# Altium integrated library Lattice CPLD ispLSI.IntLib: 471 symbols (part 2 of 26) (continued)
## ispLSI1032E-70LJI (continued)

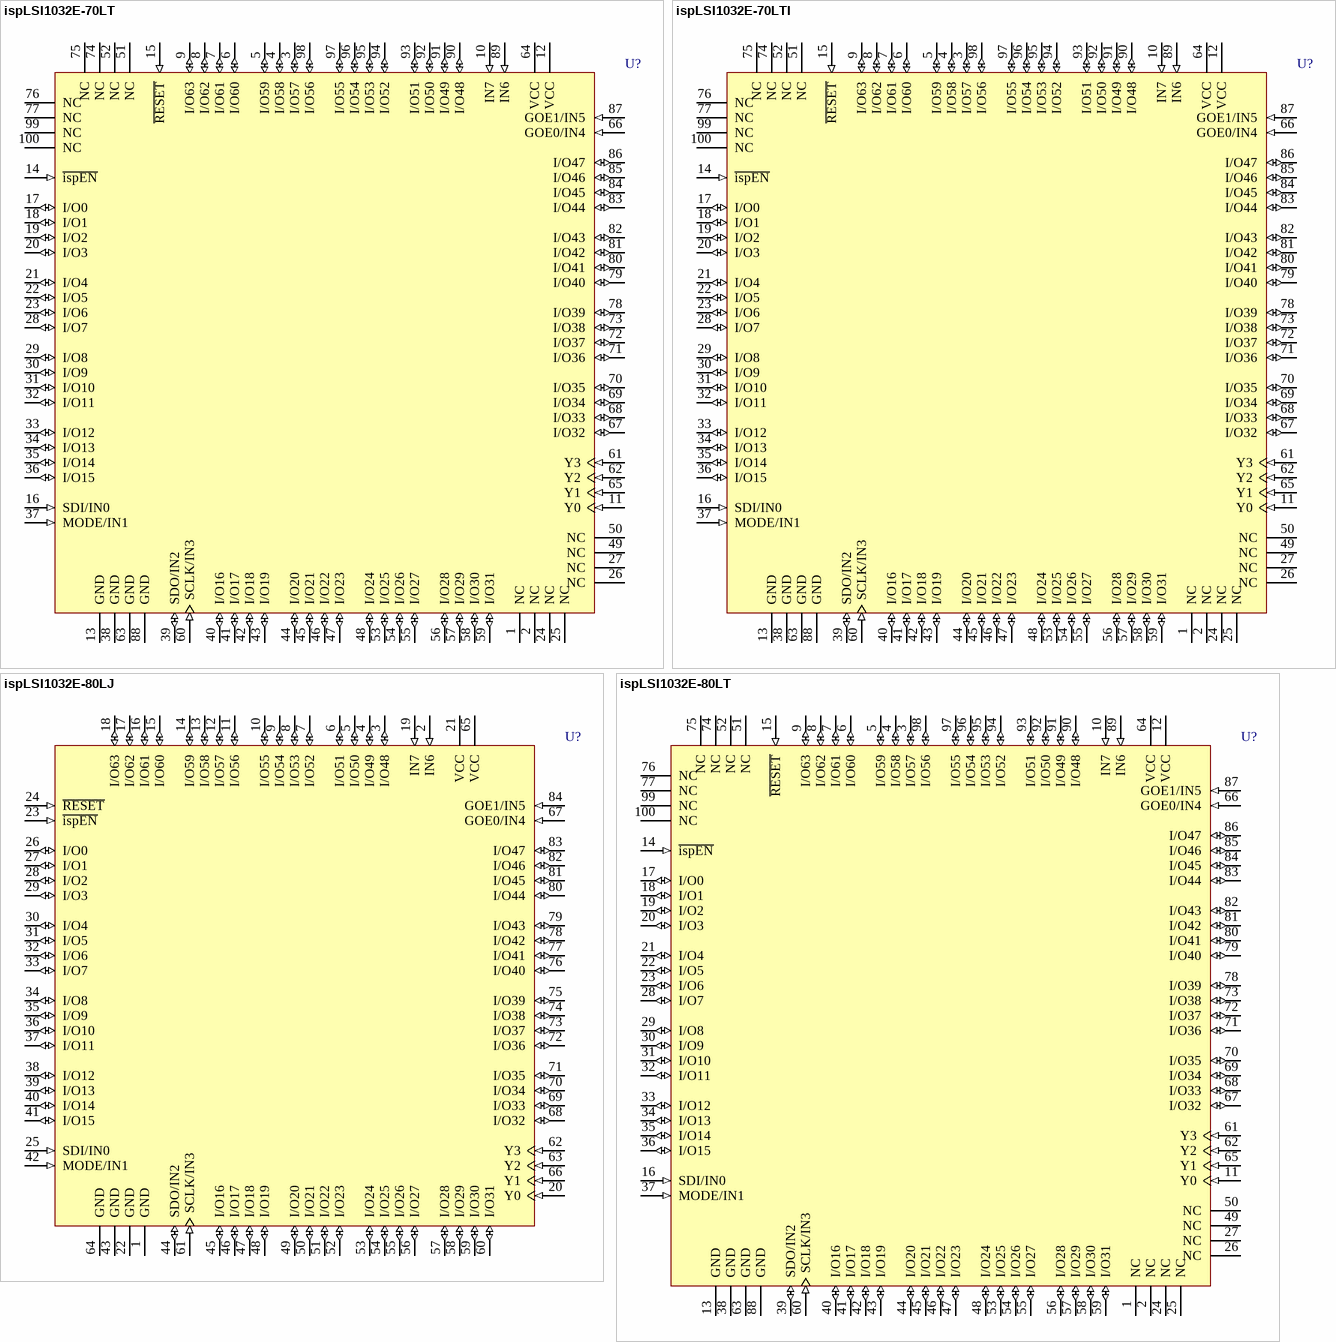
[diagram p9: symbols ispLSI1032E-70LT to ispLSI1032E-80LT]

## ispLSI1032E-70LT
designator U?
In-System Programmable High-Density PLD; Note: Pins 16, 37, 39, 60, 66 & 87 have dual function capability; Pins 66 & 87 are software selectable.; Published: 23-Sep-2002; LatestRevisionDate: 13-Apr-2006; LatestRevisionNote: IPC-7351 Footprint Added.; DatasheetVersion: Oct-1998; PackageVersion: pkg_32, Aug-2005; PackageReference: TQFP100; Publisher: Altium Limited; PackageDescription: 100-Pin Thin Quad Flat Pack (TQFP100); Code_JEDEC: MS-026-BED; ComponentLink1Description: Manufacturer Link; ComponentLink1URL: http://www.latticesemi.com/products/mature/index.cfm; ComponentLink2Description: Datasheet; ComponentLink2URL: http://www.latticesemi.com/lit/docs/datasheets/cpld/1032e.pdf
footprint TQFP100_N (Thin QFP, 100-Leads, Body 14x14mm, Pitch 0.5mm, IPC Medium Density)
footprint TQFP100_L (Thin QFP, 100-Leads, Body 14x14mm, Pitch 0.5mm, IPC High Density)
footprint TQFP100_M (Thin QFP, 100-Leads, Body 14x14mm, Pitch 0.5mm, IPC Low Density)
3D model 1032E-TQFP100 (100-Pin Thin Quad Flat Pack (TQFP100))
pins: 1 NC, 2 NC, 3 I/O57 (io), 4 I/O58 (io), 5 I/O59 (io), 6 I/O60 (io), 7 I/O61 (io), 8 I/O62 (io), 9 I/O63 (io), 10 IN7 (in), 11 Y0 (in), 12 VCC (power), 13 GND (power), 14 ~{ispEN} (in), 15 ~{RESET} (in), 16 SDI/IN0 (in), 17 I/O0 (io), 18 I/O1 (io), 19 I/O2 (io), 20 I/O3 (io), 21 I/O4 (io), 22 I/O5 (io), 23 I/O6 (io), 24 NC, 25 NC, 26 NC, 27 NC, 28 I/O7 (io), 29 I/O8 (io), 30 I/O9 (io), 31 I/O10 (io), 32 I/O11 (io), 33 I/O12 (io), 34 I/O13 (io), 35 I/O14 (io), 36 I/O15 (io), 37 MODE/IN1 (in), 38 GND (power), 39 SDO/IN2 (io), 40 I/O16 (io), 41 I/O17 (io), 42 I/O18 (io), 43 I/O19 (io), 44 I/O20 (io), 45 I/O21 (io), 46 I/O22 (io), 47 I/O23 (io), 48 I/O24 (io), 49 NC, 50 NC, 51 NC, 52 NC, 53 I/O25 (io), 54 I/O26 (io), 55 I/O27 (io), 56 I/O28 (io), 57 I/O29 (io), 58 I/O30 (io), 59 I/O31 (io), 60 SCLK/IN3 (in), 61 Y3 (in), 62 Y2 (in), 63 GND (power), 64 VCC (power), 65 Y1 (in), 66 GOE0/IN4 (in), 67 I/O32 (io), 68 I/O33 (io), 69 I/O34 (io), 70 I/O35 (io), 71 I/O36 (io), 72 I/O37 (io), 73 I/O38 (io), 74 NC, 75 NC, 76 NC, 77 NC, 78 I/O39 (io), 79 I/O40 (io), 80 I/O41 (io), 81 I/O42 (io), 82 I/O43 (io), 83 I/O44 (io), 84 I/O45 (io), 85 I/O46 (io), 86 I/O47 (io), 87 GOE1/IN5 (in), 88 GND (power), 89 IN6 (in), 90 I/O48 (io), 91 I/O49 (io), 92 I/O50 (io), 93 I/O51 (io), 94 I/O52 (io), 95 I/O53 (io), 96 I/O54 (io), 97 I/O55 (io), 98 I/O56 (io), 99 NC, 100 NC

## ispLSI1032E-70LTI
designator U?
In-System Programmable High-Density PLD; Note: Pins 16, 37, 39, 60, 66 & 87 have dual function capability; Pins 66 & 87 are software selectable.; Published: 23-Sep-2002; LatestRevisionDate: 13-Apr-2006; LatestRevisionNote: IPC-7351 Footprint Added.; DatasheetVersion: Oct-1998; PackageVersion: pkg_32, Aug-2005; PackageReference: TQFP100; Publisher: Altium Limited; PackageDescription: 100-Pin Thin Quad Flat Pack (TQFP100); Code_JEDEC: MS-026-BED; ComponentLink1Description: Manufacturer Link; ComponentLink1URL: http://www.latticesemi.com/products/mature/index.cfm; ComponentLink2Description: Datasheet; ComponentLink2URL: http://www.latticesemi.com/lit/docs/datasheets/cpld/1032e.pdf
footprint TQFP100_N (Thin QFP, 100-Leads, Body 14x14mm, Pitch 0.5mm, IPC Medium Density)
footprint TQFP100_L (Thin QFP, 100-Leads, Body 14x14mm, Pitch 0.5mm, IPC High Density)
footprint TQFP100_M (Thin QFP, 100-Leads, Body 14x14mm, Pitch 0.5mm, IPC Low Density)
3D model 1032E-TQFP100 (100-Pin Thin Quad Flat Pack (TQFP100))
pins: 1 NC, 2 NC, 3 I/O57 (io), 4 I/O58 (io), 5 I/O59 (io), 6 I/O60 (io), 7 I/O61 (io), 8 I/O62 (io), 9 I/O63 (io), 10 IN7 (in), 11 Y0 (in), 12 VCC (power), 13 GND (power), 14 ~{ispEN} (in), 15 ~{RESET} (in), 16 SDI/IN0 (in), 17 I/O0 (io), 18 I/O1 (io), 19 I/O2 (io), 20 I/O3 (io), 21 I/O4 (io), 22 I/O5 (io), 23 I/O6 (io), 24 NC, 25 NC, 26 NC, 27 NC, 28 I/O7 (io), 29 I/O8 (io), 30 I/O9 (io), 31 I/O10 (io), 32 I/O11 (io), 33 I/O12 (io), 34 I/O13 (io), 35 I/O14 (io), 36 I/O15 (io), 37 MODE/IN1 (in), 38 GND (power), 39 SDO/IN2 (io), 40 I/O16 (io), 41 I/O17 (io), 42 I/O18 (io), 43 I/O19 (io), 44 I/O20 (io), 45 I/O21 (io), 46 I/O22 (io), 47 I/O23 (io), 48 I/O24 (io), 49 NC, 50 NC, 51 NC, 52 NC, 53 I/O25 (io), 54 I/O26 (io), 55 I/O27 (io), 56 I/O28 (io), 57 I/O29 (io), 58 I/O30 (io), 59 I/O31 (io), 60 SCLK/IN3 (in), 61 Y3 (in), 62 Y2 (in), 63 GND (power), 64 VCC (power), 65 Y1 (in), 66 GOE0/IN4 (in), 67 I/O32 (io), 68 I/O33 (io), 69 I/O34 (io), 70 I/O35 (io), 71 I/O36 (io), 72 I/O37 (io), 73 I/O38 (io), 74 NC, 75 NC, 76 NC, 77 NC, 78 I/O39 (io), 79 I/O40 (io), 80 I/O41 (io), 81 I/O42 (io), 82 I/O43 (io), 83 I/O44 (io), 84 I/O45 (io), 85 I/O46 (io), 86 I/O47 (io), 87 GOE1/IN5 (in), 88 GND (power), 89 IN6 (in), 90 I/O48 (io), 91 I/O49 (io), 92 I/O50 (io), 93 I/O51 (io), 94 I/O52 (io), 95 I/O53 (io), 96 I/O54 (io), 97 I/O55 (io), 98 I/O56 (io), 99 NC, 100 NC

## ispLSI1032E-80LJ
designator U?
In-System Programmable High-Density PLD; Note: Pins 25, 42, 44, 61, 67 & 84 have dual function capability; Pins 67 & 84 are software selectable.; Published: 23-Sep-2002; LatestRevisionDate: 13-Apr-2006; LatestRevisionNote: IPC-7351 Footprint Added.; DatasheetVersion: Oct-1998; PackageVersion: pkg_32, Aug-2005; PackageReference: PLCC84; Publisher: Altium Limited; PackageDescription: 84-Pin Leaded Chip Carrier 1.27 mm Pitch; Code_IPC: PLCC-84; ComponentLink1Description: Manufacturer Link; ComponentLink1URL: http://www.latticesemi.com/products/mature/index.cfm; ComponentLink2Description: Datasheet; ComponentLink2URL: http://www.latticesemi.com/lit/docs/datasheets/cpld/1032e.pdf
footprint PLCC84_N (Leaded Chip Carrier, 84-Leads, Body 29.3x29.3mm, Pitch 1.27mm, IPC Medium Density)
footprint PLCC84_L (Leaded Chip Carrier, 84-Leads, Body 29.3x29.3mm, Pitch 1.27mm, IPC High Density)
footprint PLCC84_M (Leaded Chip Carrier, 84-Leads, Body 29.3x29.3mm, Pitch 1.27mm, IPC Low Density)
3D model 1032E-PLCC84 (84-Pin Leaded Chip Carrier 1.27 mm Pitch)
pins: 1 GND (power), 2 IN6 (in), 3 I/O48 (io), 4 I/O49 (io), 5 I/O50 (io), 6 I/O51 (io), 7 I/O52 (io), 8 I/O53 (io), 9 I/O54 (io), 10 I/O55 (io), 11 I/O56 (io), 12 I/O57 (io), 13 I/O58 (io), 14 I/O59 (io), 15 I/O60 (io), 16 I/O61 (io), 17 I/O62 (io), 18 I/O63 (io), 19 IN7 (in), 20 Y0 (in), 21 VCC (power), 22 GND (power), 23 ~{isp}~{EN} (in), 24 ~{RESET} (in), 25 SDI/IN0 (in), 26 I/O0 (io), 27 I/O1 (io), 28 I/O2 (io), 29 I/O3 (io), 30 I/O4 (io), 31 I/O5 (io), 32 I/O6 (io), 33 I/O7 (io), 34 I/O8 (io), 35 I/O9 (io), 36 I/O10 (io), 37 I/O11 (io), 38 I/O12 (io), 39 I/O13 (io), 40 I/O14 (io), 41 I/O15 (io), 42 MODE/IN1 (in), 43 GND (power), 44 SDO/IN2 (io), 45 I/O16 (io), 46 I/O17 (io), 47 I/O18 (io), 48 I/O19 (io), 49 I/O20 (io), 50 I/O21 (io), 51 I/O22 (io), 52 I/O23 (io), 53 I/O24 (io), 54 I/O25 (io), 55 I/O26 (io), 56 I/O27 (io), 57 I/O28 (io), 58 I/O29 (io), 59 I/O30 (io), 60 I/O31 (io), 61 SCLK/IN3 (in), 62 Y3 (in), 63 Y2 (in), 64 GND (power), 65 VCC (power), 66 Y1 (in), 67 GOE0/IN4 (in), 68 I/O32 (io), 69 I/O33 (io), 70 I/O34 (io), 71 I/O35 (io), 72 I/O36 (io), 73 I/O37 (io), 74 I/O38 (io), 75 I/O39 (io), 76 I/O40 (io), 77 I/O41 (io), 78 I/O42 (io), 79 I/O43 (io), 80 I/O44 (io), 81 I/O45 (io), 82 I/O46 (io), 83 I/O47 (io), 84 GOE1/IN5 (in)

## ispLSI1032E-80LT
designator U?
In-System Programmable High-Density PLD; Note: Pins 16, 37, 39, 60, 66 & 87 have dual function capability; Pins 66 & 87 are software selectable.; Published: 23-Sep-2002; LatestRevisionDate: 13-Apr-2006; LatestRevisionNote: IPC-7351 Footprint Added.; DatasheetVersion: Oct-1998; PackageVersion: pkg_32, Aug-2005; PackageReference: TQFP100; Publisher: Altium Limited; PackageDescription: 100-Pin Thin Quad Flat Pack (TQFP100); Code_JEDEC: MS-026-BED; ComponentLink1Description: Manufacturer Link; ComponentLink1URL: http://www.latticesemi.com/products/mature/index.cfm; ComponentLink2Description: Datasheet; ComponentLink2URL: http://www.latticesemi.com/lit/docs/datasheets/cpld/1032e.pdf
footprint TQFP100_N (Thin QFP, 100-Leads, Body 14x14mm, Pitch 0.5mm, IPC Medium Density)
footprint TQFP100_L (Thin QFP, 100-Leads, Body 14x14mm, Pitch 0.5mm, IPC High Density)
footprint TQFP100_M (Thin QFP, 100-Leads, Body 14x14mm, Pitch 0.5mm, IPC Low Density)
3D model 1032E-TQFP100 (100-Pin Thin Quad Flat Pack (TQFP100))
pins: 1 NC, 2 NC, 3 I/O57 (io), 4 I/O58 (io), 5 I/O59 (io), 6 I/O60 (io), 7 I/O61 (io), 8 I/O62 (io), 9 I/O63 (io), 10 IN7 (in), 11 Y0 (in), 12 VCC (power), 13 GND (power), 14 ~{ispEN} (in), 15 ~{RESET} (in), 16 SDI/IN0 (in), 17 I/O0 (io), 18 I/O1 (io), 19 I/O2 (io), 20 I/O3 (io), 21 I/O4 (io), 22 I/O5 (io), 23 I/O6 (io), 24 NC, 25 NC, 26 NC, 27 NC, 28 I/O7 (io), 29 I/O8 (io), 30 I/O9 (io), 31 I/O10 (io), 32 I/O11 (io), 33 I/O12 (io), 34 I/O13 (io), 35 I/O14 (io), 36 I/O15 (io), 37 MODE/IN1 (in), 38 GND (power), 39 SDO/IN2 (io), 40 I/O16 (io), 41 I/O17 (io), 42 I/O18 (io), 43 I/O19 (io), 44 I/O20 (io), 45 I/O21 (io), 46 I/O22 (io), 47 I/O23 (io), 48 I/O24 (io), 49 NC, 50 NC, 51 NC, 52 NC, 53 I/O25 (io), 54 I/O26 (io), 55 I/O27 (io), 56 I/O28 (io), 57 I/O29 (io), 58 I/O30 (io), 59 I/O31 (io), 60 SCLK/IN3 (in), 61 Y3 (in), 62 Y2 (in), 63 GND (power), 64 VCC (power), 65 Y1 (in), 66 GOE0/IN4 (in), 67 I/O32 (io), 68 I/O33 (io), 69 I/O34 (io), 70 I/O35 (io), 71 I/O36 (io), 72 I/O37 (io), 73 I/O38 (io), 74 NC, 75 NC, 76 NC, 77 NC, 78 I/O39 (io), 79 I/O40 (io), 80 I/O41 (io), 81 I/O42 (io), 82 I/O43 (io), 83 I/O44 (io), 84 I/O45 (io), 85 I/O46 (io), 86 I/O47 (io), 87 GOE1/IN5 (in), 88 GND (power), 89 IN6 (in), 90 I/O48 (io), 91 I/O49 (io), 92 I/O50 (io), 93 I/O51 (io), 94 I/O52 (io), 95 I/O53 (io), 96 I/O54 (io), 97 I/O55 (io), 98 I/O56 (io), 99 NC, 100 NC

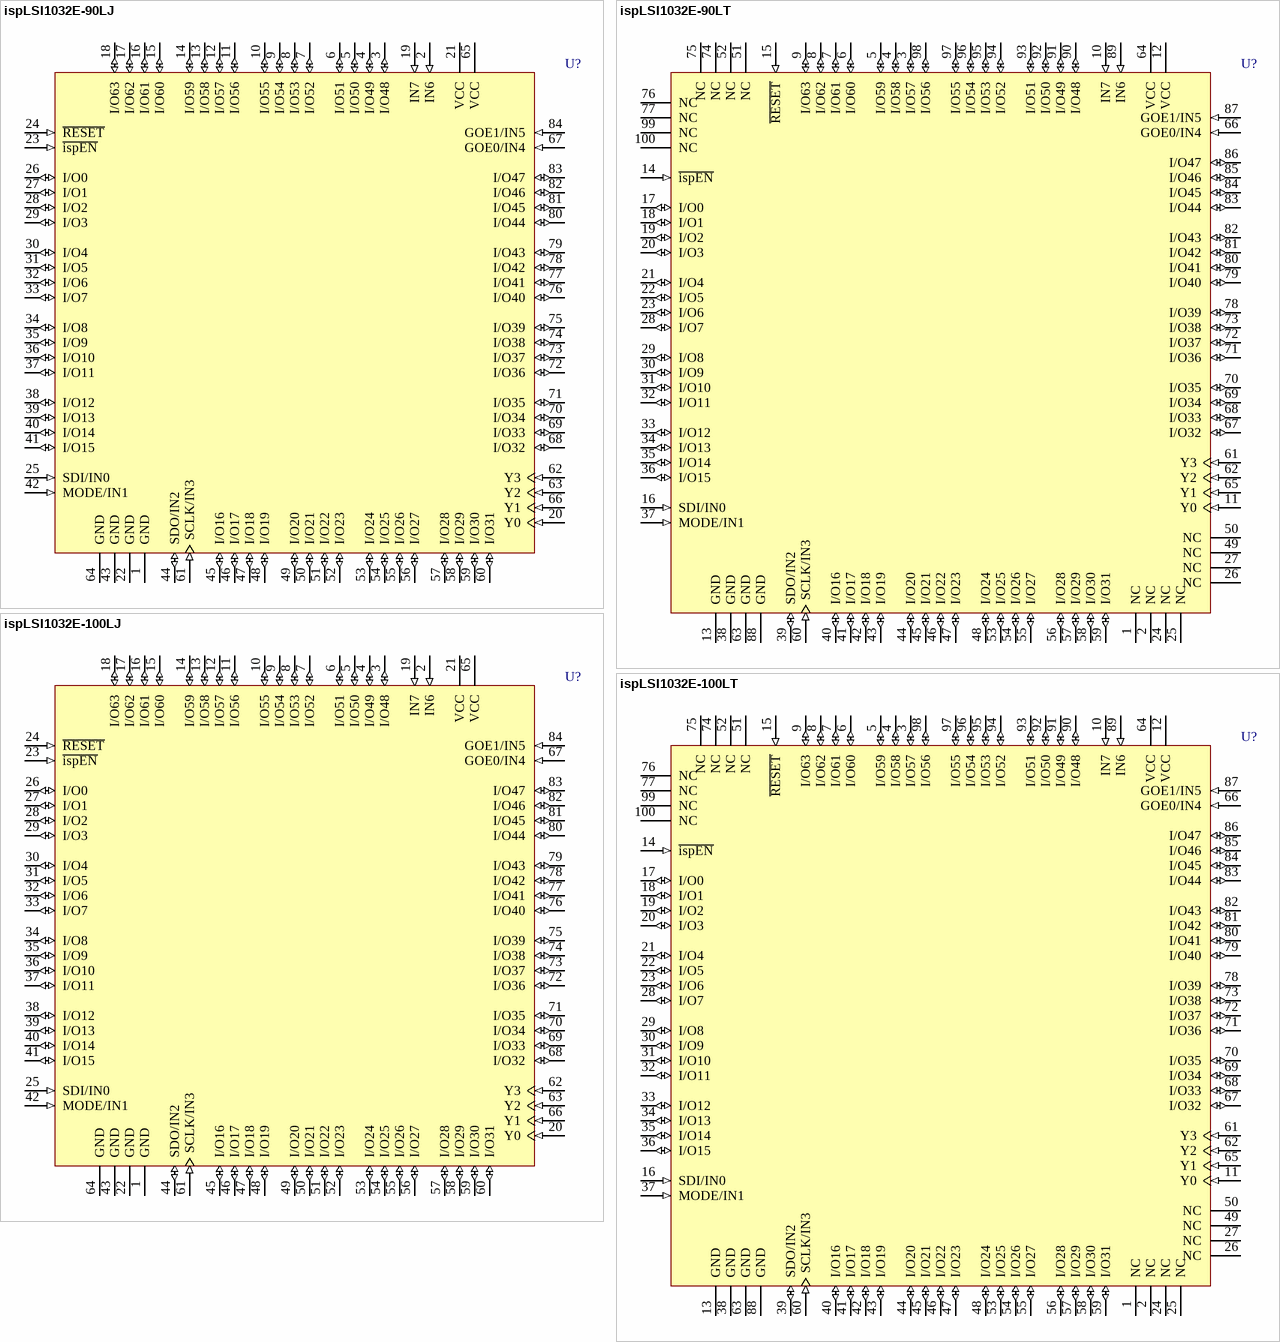
[diagram p10: symbols ispLSI1032E-90LJ to ispLSI1032E-100LT]

## ispLSI1032E-90LJ
designator U?
In-System Programmable High-Density PLD; Note: Pins 25, 42, 44, 61, 67 & 84 have dual function capability; Pins 67 & 84 are software selectable.; Published: 23-Sep-2002; LatestRevisionDate: 13-Apr-2006; LatestRevisionNote: IPC-7351 Footprint Added.; DatasheetVersion: Oct-1998; PackageVersion: pkg_32, Aug-2005; PackageReference: PLCC84; Publisher: Altium Limited; PackageDescription: 84-Pin Leaded Chip Carrier 1.27 mm Pitch; Code_IPC: PLCC-84; ComponentLink1Description: Manufacturer Link; ComponentLink1URL: http://www.latticesemi.com/products/mature/index.cfm; ComponentLink2Description: Datasheet; ComponentLink2URL: http://www.latticesemi.com/lit/docs/datasheets/cpld/1032e.pdf
footprint PLCC84_N (Leaded Chip Carrier, 84-Leads, Body 29.3x29.3mm, Pitch 1.27mm, IPC Medium Density)
footprint PLCC84_L (Leaded Chip Carrier, 84-Leads, Body 29.3x29.3mm, Pitch 1.27mm, IPC High Density)
footprint PLCC84_M (Leaded Chip Carrier, 84-Leads, Body 29.3x29.3mm, Pitch 1.27mm, IPC Low Density)
3D model 1032E-PLCC84 (84-Pin Leaded Chip Carrier 1.27 mm Pitch)
pins: 1 GND (power), 2 IN6 (in), 3 I/O48 (io), 4 I/O49 (io), 5 I/O50 (io), 6 I/O51 (io), 7 I/O52 (io), 8 I/O53 (io), 9 I/O54 (io), 10 I/O55 (io), 11 I/O56 (io), 12 I/O57 (io), 13 I/O58 (io), 14 I/O59 (io), 15 I/O60 (io), 16 I/O61 (io), 17 I/O62 (io), 18 I/O63 (io), 19 IN7 (in), 20 Y0 (in), 21 VCC (power), 22 GND (power), 23 ~{isp}~{EN} (in), 24 ~{RESET} (in), 25 SDI/IN0 (in), 26 I/O0 (io), 27 I/O1 (io), 28 I/O2 (io), 29 I/O3 (io), 30 I/O4 (io), 31 I/O5 (io), 32 I/O6 (io), 33 I/O7 (io), 34 I/O8 (io), 35 I/O9 (io), 36 I/O10 (io), 37 I/O11 (io), 38 I/O12 (io), 39 I/O13 (io), 40 I/O14 (io), 41 I/O15 (io), 42 MODE/IN1 (in), 43 GND (power), 44 SDO/IN2 (io), 45 I/O16 (io), 46 I/O17 (io), 47 I/O18 (io), 48 I/O19 (io), 49 I/O20 (io), 50 I/O21 (io), 51 I/O22 (io), 52 I/O23 (io), 53 I/O24 (io), 54 I/O25 (io), 55 I/O26 (io), 56 I/O27 (io), 57 I/O28 (io), 58 I/O29 (io), 59 I/O30 (io), 60 I/O31 (io), 61 SCLK/IN3 (in), 62 Y3 (in), 63 Y2 (in), 64 GND (power), 65 VCC (power), 66 Y1 (in), 67 GOE0/IN4 (in), 68 I/O32 (io), 69 I/O33 (io), 70 I/O34 (io), 71 I/O35 (io), 72 I/O36 (io), 73 I/O37 (io), 74 I/O38 (io), 75 I/O39 (io), 76 I/O40 (io), 77 I/O41 (io), 78 I/O42 (io), 79 I/O43 (io), 80 I/O44 (io), 81 I/O45 (io), 82 I/O46 (io), 83 I/O47 (io), 84 GOE1/IN5 (in)

## ispLSI1032E-90LT
designator U?
In-System Programmable High-Density PLD; Note: Pins 16, 37, 39, 60, 66 & 87 have dual function capability; Pins 66 & 87 are software selectable.; Published: 23-Sep-2002; LatestRevisionDate: 13-Apr-2006; LatestRevisionNote: IPC-7351 Footprint Added.; DatasheetVersion: Oct-1998; PackageVersion: pkg_32, Aug-2005; PackageReference: TQFP100; Publisher: Altium Limited; PackageDescription: 100-Pin Thin Quad Flat Pack (TQFP100); Code_JEDEC: MS-026-BED; ComponentLink1Description: Manufacturer Link; ComponentLink1URL: http://www.latticesemi.com/products/mature/index.cfm; ComponentLink2Description: Datasheet; ComponentLink2URL: http://www.latticesemi.com/lit/docs/datasheets/cpld/1032e.pdf
footprint TQFP100_N (Thin QFP, 100-Leads, Body 14x14mm, Pitch 0.5mm, IPC Medium Density)
footprint TQFP100_L (Thin QFP, 100-Leads, Body 14x14mm, Pitch 0.5mm, IPC High Density)
footprint TQFP100_M (Thin QFP, 100-Leads, Body 14x14mm, Pitch 0.5mm, IPC Low Density)
3D model 1032E-TQFP100 (100-Pin Thin Quad Flat Pack (TQFP100))
pins: 1 NC, 2 NC, 3 I/O57 (io), 4 I/O58 (io), 5 I/O59 (io), 6 I/O60 (io), 7 I/O61 (io), 8 I/O62 (io), 9 I/O63 (io), 10 IN7 (in), 11 Y0 (in), 12 VCC (power), 13 GND (power), 14 ~{ispEN} (in), 15 ~{RESET} (in), 16 SDI/IN0 (in), 17 I/O0 (io), 18 I/O1 (io), 19 I/O2 (io), 20 I/O3 (io), 21 I/O4 (io), 22 I/O5 (io), 23 I/O6 (io), 24 NC, 25 NC, 26 NC, 27 NC, 28 I/O7 (io), 29 I/O8 (io), 30 I/O9 (io), 31 I/O10 (io), 32 I/O11 (io), 33 I/O12 (io), 34 I/O13 (io), 35 I/O14 (io), 36 I/O15 (io), 37 MODE/IN1 (in), 38 GND (power), 39 SDO/IN2 (io), 40 I/O16 (io), 41 I/O17 (io), 42 I/O18 (io), 43 I/O19 (io), 44 I/O20 (io), 45 I/O21 (io), 46 I/O22 (io), 47 I/O23 (io), 48 I/O24 (io), 49 NC, 50 NC, 51 NC, 52 NC, 53 I/O25 (io), 54 I/O26 (io), 55 I/O27 (io), 56 I/O28 (io), 57 I/O29 (io), 58 I/O30 (io), 59 I/O31 (io), 60 SCLK/IN3 (in), 61 Y3 (in), 62 Y2 (in), 63 GND (power), 64 VCC (power), 65 Y1 (in), 66 GOE0/IN4 (in), 67 I/O32 (io), 68 I/O33 (io), 69 I/O34 (io), 70 I/O35 (io), 71 I/O36 (io), 72 I/O37 (io), 73 I/O38 (io), 74 NC, 75 NC, 76 NC, 77 NC, 78 I/O39 (io), 79 I/O40 (io), 80 I/O41 (io), 81 I/O42 (io), 82 I/O43 (io), 83 I/O44 (io), 84 I/O45 (io), 85 I/O46 (io), 86 I/O47 (io), 87 GOE1/IN5 (in), 88 GND (power), 89 IN6 (in), 90 I/O48 (io), 91 I/O49 (io), 92 I/O50 (io), 93 I/O51 (io), 94 I/O52 (io), 95 I/O53 (io), 96 I/O54 (io), 97 I/O55 (io), 98 I/O56 (io), 99 NC, 100 NC

## ispLSI1032E-100LJ
designator U?
In-System Programmable High-Density PLD; Note: Pins 25, 42, 44, 61, 67 & 84 have dual function capability; Pins 67 & 84 are software selectable.; Published: 23-Sep-2002; LatestRevisionDate: 13-Apr-2006; LatestRevisionNote: IPC-7351 Footprint Added.; DatasheetVersion: Oct-1998; PackageVersion: pkg_32, Aug-2005; PackageReference: PLCC84; Publisher: Altium Limited; PackageDescription: 84-Pin Leaded Chip Carrier 1.27 mm Pitch; Code_IPC: PLCC-84; ComponentLink1Description: Manufacturer Link; ComponentLink1URL: http://www.latticesemi.com/products/mature/index.cfm; ComponentLink2Description: Datasheet; ComponentLink2URL: http://www.latticesemi.com/lit/docs/datasheets/cpld/1032e.pdf
footprint PLCC84_N (Leaded Chip Carrier, 84-Leads, Body 29.3x29.3mm, Pitch 1.27mm, IPC Medium Density)
footprint PLCC84_L (Leaded Chip Carrier, 84-Leads, Body 29.3x29.3mm, Pitch 1.27mm, IPC High Density)
footprint PLCC84_M (Leaded Chip Carrier, 84-Leads, Body 29.3x29.3mm, Pitch 1.27mm, IPC Low Density)
3D model 1032E-PLCC84 (84-Pin Leaded Chip Carrier 1.27 mm Pitch)
pins: 1 GND (power), 2 IN6 (in), 3 I/O48 (io), 4 I/O49 (io), 5 I/O50 (io), 6 I/O51 (io), 7 I/O52 (io), 8 I/O53 (io), 9 I/O54 (io), 10 I/O55 (io), 11 I/O56 (io), 12 I/O57 (io), 13 I/O58 (io), 14 I/O59 (io), 15 I/O60 (io), 16 I/O61 (io), 17 I/O62 (io), 18 I/O63 (io), 19 IN7 (in), 20 Y0 (in), 21 VCC (power), 22 GND (power), 23 ~{isp}~{EN} (in), 24 ~{RESET} (in), 25 SDI/IN0 (in), 26 I/O0 (io), 27 I/O1 (io), 28 I/O2 (io), 29 I/O3 (io), 30 I/O4 (io), 31 I/O5 (io), 32 I/O6 (io), 33 I/O7 (io), 34 I/O8 (io), 35 I/O9 (io), 36 I/O10 (io), 37 I/O11 (io), 38 I/O12 (io), 39 I/O13 (io), 40 I/O14 (io), 41 I/O15 (io), 42 MODE/IN1 (in), 43 GND (power), 44 SDO/IN2 (io), 45 I/O16 (io), 46 I/O17 (io), 47 I/O18 (io), 48 I/O19 (io), 49 I/O20 (io), 50 I/O21 (io), 51 I/O22 (io), 52 I/O23 (io), 53 I/O24 (io), 54 I/O25 (io), 55 I/O26 (io), 56 I/O27 (io), 57 I/O28 (io), 58 I/O29 (io), 59 I/O30 (io), 60 I/O31 (io), 61 SCLK/IN3 (in), 62 Y3 (in), 63 Y2 (in), 64 GND (power), 65 VCC (power), 66 Y1 (in), 67 GOE0/IN4 (in), 68 I/O32 (io), 69 I/O33 (io), 70 I/O34 (io), 71 I/O35 (io), 72 I/O36 (io), 73 I/O37 (io), 74 I/O38 (io), 75 I/O39 (io), 76 I/O40 (io), 77 I/O41 (io), 78 I/O42 (io), 79 I/O43 (io), 80 I/O44 (io), 81 I/O45 (io), 82 I/O46 (io), 83 I/O47 (io), 84 GOE1/IN5 (in)

## ispLSI1032E-100LT
designator U?
In-System Programmable High-Density PLD; Note: Pins 16, 37, 39, 60, 66 & 87 have dual function capability; Pins 66 & 87 are software selectable.; Published: 23-Sep-2002; LatestRevisionDate: 13-Apr-2006; LatestRevisionNote: IPC-7351 Footprint Added.; DatasheetVersion: Oct-1998; PackageVersion: pkg_32, Aug-2005; PackageReference: TQFP100; Publisher: Altium Limited; PackageDescription: 100-Pin Thin Quad Flat Pack (TQFP100); Code_JEDEC: MS-026-BED; ComponentLink1Description: Manufacturer Link; ComponentLink1URL: http://www.latticesemi.com/products/mature/index.cfm; ComponentLink2Description: Datasheet; ComponentLink2URL: http://www.latticesemi.com/lit/docs/datasheets/cpld/1032e.pdf
footprint TQFP100_N (Thin QFP, 100-Leads, Body 14x14mm, Pitch 0.5mm, IPC Medium Density)
footprint TQFP100_L (Thin QFP, 100-Leads, Body 14x14mm, Pitch 0.5mm, IPC High Density)
footprint TQFP100_M (Thin QFP, 100-Leads, Body 14x14mm, Pitch 0.5mm, IPC Low Density)
3D model 1032E-TQFP100 (100-Pin Thin Quad Flat Pack (TQFP100))
pins: 1 NC, 2 NC, 3 I/O57 (io), 4 I/O58 (io), 5 I/O59 (io), 6 I/O60 (io), 7 I/O61 (io), 8 I/O62 (io), 9 I/O63 (io), 10 IN7 (in), 11 Y0 (in), 12 VCC (power), 13 GND (power), 14 ~{ispEN} (in), 15 ~{RESET} (in), 16 SDI/IN0 (in), 17 I/O0 (io), 18 I/O1 (io), 19 I/O2 (io), 20 I/O3 (io), 21 I/O4 (io), 22 I/O5 (io), 23 I/O6 (io), 24 NC, 25 NC, 26 NC, 27 NC, 28 I/O7 (io), 29 I/O8 (io), 30 I/O9 (io), 31 I/O10 (io), 32 I/O11 (io), 33 I/O12 (io), 34 I/O13 (io), 35 I/O14 (io), 36 I/O15 (io), 37 MODE/IN1 (in), 38 GND (power), 39 SDO/IN2 (io), 40 I/O16 (io), 41 I/O17 (io), 42 I/O18 (io), 43 I/O19 (io), 44 I/O20 (io), 45 I/O21 (io), 46 I/O22 (io), 47 I/O23 (io), 48 I/O24 (io), 49 NC, 50 NC, 51 NC, 52 NC, 53 I/O25 (io), 54 I/O26 (io), 55 I/O27 (io), 56 I/O28 (io), 57 I/O29 (io), 58 I/O30 (io), 59 I/O31 (io), 60 SCLK/IN3 (in), 61 Y3 (in), 62 Y2 (in), 63 GND (power), 64 VCC (power), 65 Y1 (in), 66 GOE0/IN4 (in), 67 I/O32 (io), 68 I/O33 (io), 69 I/O34 (io), 70 I/O35 (io), 71 I/O36 (io), 72 I/O37 (io), 73 I/O38 (io), 74 NC, 75 NC, 76 NC, 77 NC, 78 I/O39 (io), 79 I/O40 (io), 80 I/O41 (io), 81 I/O42 (io), 82 I/O43 (io), 83 I/O44 (io), 84 I/O45 (io), 85 I/O46 (io), 86 I/O47 (io), 87 GOE1/IN5 (in), 88 GND (power), 89 IN6 (in), 90 I/O48 (io), 91 I/O49 (io), 92 I/O50 (io), 93 I/O51 (io), 94 I/O52 (io), 95 I/O53 (io), 96 I/O54 (io), 97 I/O55 (io), 98 I/O56 (io), 99 NC, 100 NC

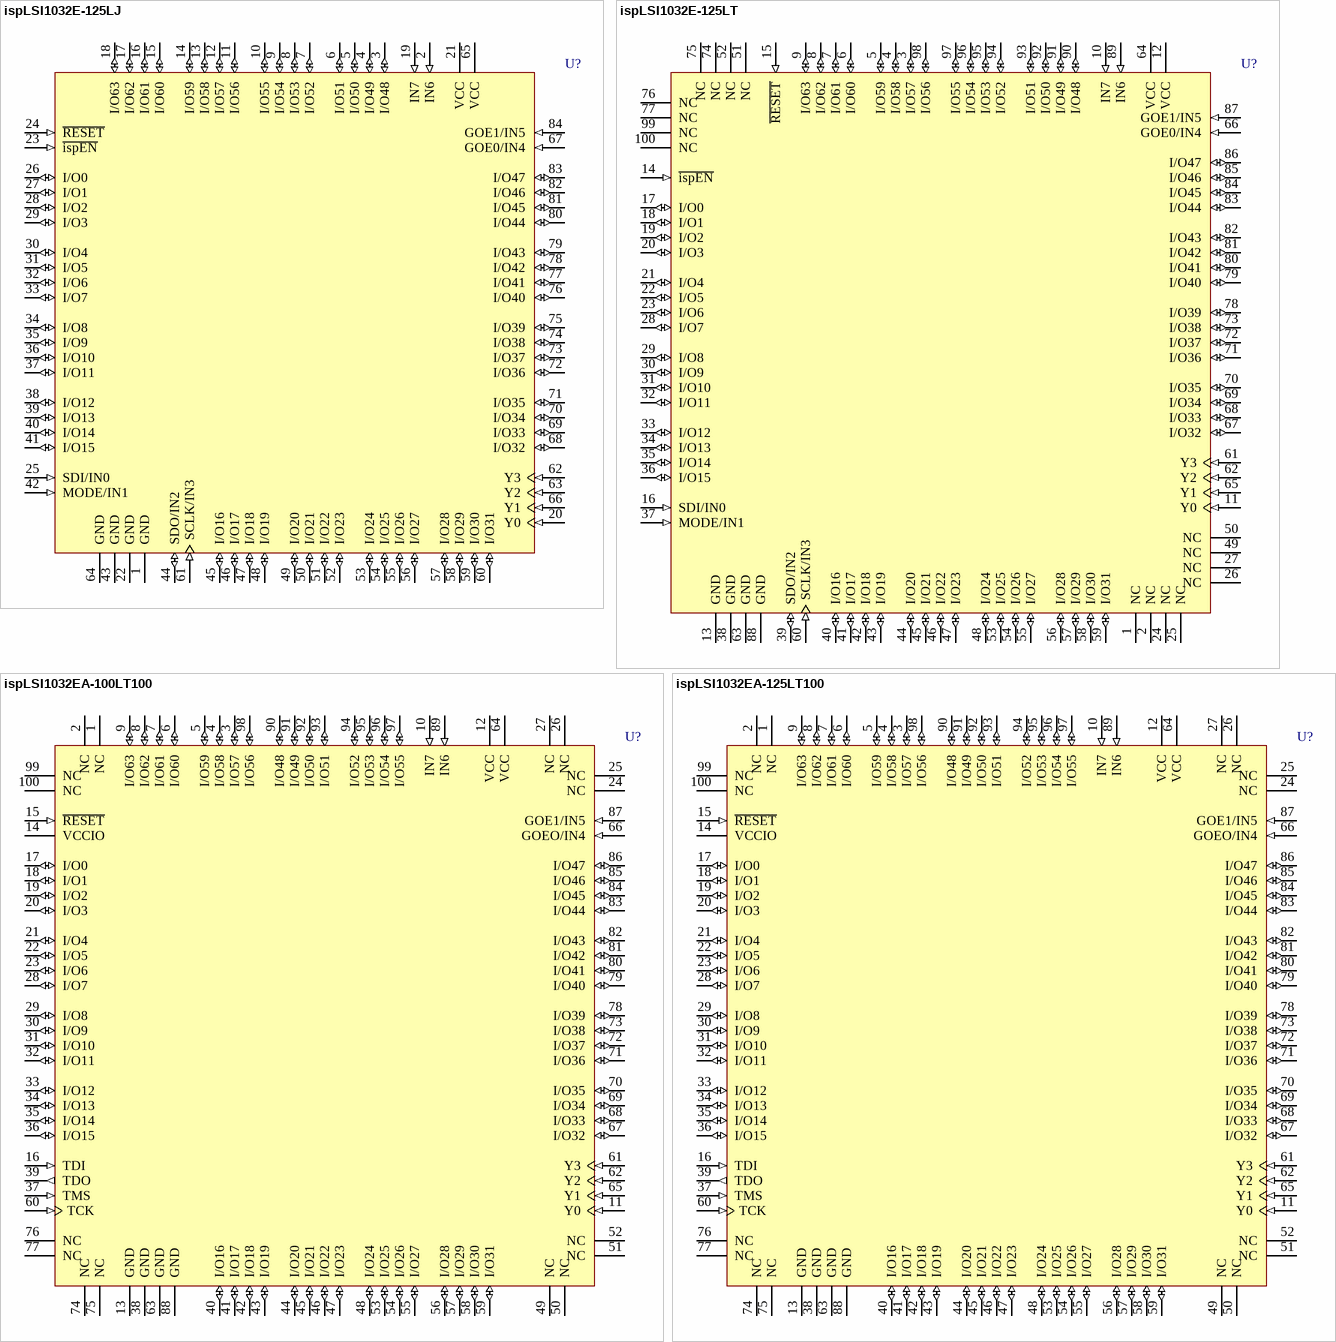
[diagram p11: symbols ispLSI1032E-125LJ to ispLSI1032EA-125LT100]

## ispLSI1032E-125LJ
designator U?
In-System Programmable High-Density PLD; Note: Pins 25, 42, 44, 61, 67 & 84 have dual function capability; Pins 67 & 84 are software selectable.; Published: 23-Sep-2002; LatestRevisionDate: 13-Apr-2006; LatestRevisionNote: IPC-7351 Footprint Added.; DatasheetVersion: Oct-1998; PackageVersion: pkg_32, Aug-2005; PackageReference: PLCC84; Publisher: Altium Limited; PackageDescription: 84-Pin Leaded Chip Carrier 1.27 mm Pitch; Code_IPC: PLCC-84; ComponentLink1Description: Manufacturer Link; ComponentLink1URL: http://www.latticesemi.com/products/mature/index.cfm; ComponentLink2Description: Datasheet; ComponentLink2URL: http://www.latticesemi.com/lit/docs/datasheets/cpld/1032e.pdf
footprint PLCC84_N (Leaded Chip Carrier, 84-Leads, Body 29.3x29.3mm, Pitch 1.27mm, IPC Medium Density)
footprint PLCC84_L (Leaded Chip Carrier, 84-Leads, Body 29.3x29.3mm, Pitch 1.27mm, IPC High Density)
footprint PLCC84_M (Leaded Chip Carrier, 84-Leads, Body 29.3x29.3mm, Pitch 1.27mm, IPC Low Density)
3D model 1032E-PLCC84 (84-Pin Leaded Chip Carrier 1.27 mm Pitch)
pins: 1 GND (power), 2 IN6 (in), 3 I/O48 (io), 4 I/O49 (io), 5 I/O50 (io), 6 I/O51 (io), 7 I/O52 (io), 8 I/O53 (io), 9 I/O54 (io), 10 I/O55 (io), 11 I/O56 (io), 12 I/O57 (io), 13 I/O58 (io), 14 I/O59 (io), 15 I/O60 (io), 16 I/O61 (io), 17 I/O62 (io), 18 I/O63 (io), 19 IN7 (in), 20 Y0 (in), 21 VCC (power), 22 GND (power), 23 ~{isp}~{EN} (in), 24 ~{RESET} (in), 25 SDI/IN0 (in), 26 I/O0 (io), 27 I/O1 (io), 28 I/O2 (io), 29 I/O3 (io), 30 I/O4 (io), 31 I/O5 (io), 32 I/O6 (io), 33 I/O7 (io), 34 I/O8 (io), 35 I/O9 (io), 36 I/O10 (io), 37 I/O11 (io), 38 I/O12 (io), 39 I/O13 (io), 40 I/O14 (io), 41 I/O15 (io), 42 MODE/IN1 (in), 43 GND (power), 44 SDO/IN2 (io), 45 I/O16 (io), 46 I/O17 (io), 47 I/O18 (io), 48 I/O19 (io), 49 I/O20 (io), 50 I/O21 (io), 51 I/O22 (io), 52 I/O23 (io), 53 I/O24 (io), 54 I/O25 (io), 55 I/O26 (io), 56 I/O27 (io), 57 I/O28 (io), 58 I/O29 (io), 59 I/O30 (io), 60 I/O31 (io), 61 SCLK/IN3 (in), 62 Y3 (in), 63 Y2 (in), 64 GND (power), 65 VCC (power), 66 Y1 (in), 67 GOE0/IN4 (in), 68 I/O32 (io), 69 I/O33 (io), 70 I/O34 (io), 71 I/O35 (io), 72 I/O36 (io), 73 I/O37 (io), 74 I/O38 (io), 75 I/O39 (io), 76 I/O40 (io), 77 I/O41 (io), 78 I/O42 (io), 79 I/O43 (io), 80 I/O44 (io), 81 I/O45 (io), 82 I/O46 (io), 83 I/O47 (io), 84 GOE1/IN5 (in)

## ispLSI1032E-125LT
designator U?
In-System Programmable High-Density PLD; Note: Pins 16, 37, 39, 60, 66 & 87 have dual function capability; Pins 66 & 87 are software selectable.; Published: 23-Sep-2002; LatestRevisionDate: 13-Apr-2006; LatestRevisionNote: IPC-7351 Footprint Added.; DatasheetVersion: Oct-1998; PackageVersion: pkg_32, Aug-2005; PackageReference: TQFP100; Publisher: Altium Limited; PackageDescription: 100-Pin Thin Quad Flat Pack (TQFP100); Code_JEDEC: MS-026-BED; ComponentLink1Description: Manufacturer Link; ComponentLink1URL: http://www.latticesemi.com/products/mature/index.cfm; ComponentLink2Description: Datasheet; ComponentLink2URL: http://www.latticesemi.com/lit/docs/datasheets/cpld/1032e.pdf
footprint TQFP100_N (Thin QFP, 100-Leads, Body 14x14mm, Pitch 0.5mm, IPC Medium Density)
footprint TQFP100_L (Thin QFP, 100-Leads, Body 14x14mm, Pitch 0.5mm, IPC High Density)
footprint TQFP100_M (Thin QFP, 100-Leads, Body 14x14mm, Pitch 0.5mm, IPC Low Density)
3D model 1032E-TQFP100 (100-Pin Thin Quad Flat Pack (TQFP100))
pins: 1 NC, 2 NC, 3 I/O57 (io), 4 I/O58 (io), 5 I/O59 (io), 6 I/O60 (io), 7 I/O61 (io), 8 I/O62 (io), 9 I/O63 (io), 10 IN7 (in), 11 Y0 (in), 12 VCC (power), 13 GND (power), 14 ~{ispEN} (in), 15 ~{RESET} (in), 16 SDI/IN0 (in), 17 I/O0 (io), 18 I/O1 (io), 19 I/O2 (io), 20 I/O3 (io), 21 I/O4 (io), 22 I/O5 (io), 23 I/O6 (io), 24 NC, 25 NC, 26 NC, 27 NC, 28 I/O7 (io), 29 I/O8 (io), 30 I/O9 (io), 31 I/O10 (io), 32 I/O11 (io), 33 I/O12 (io), 34 I/O13 (io), 35 I/O14 (io), 36 I/O15 (io), 37 MODE/IN1 (in), 38 GND (power), 39 SDO/IN2 (io), 40 I/O16 (io), 41 I/O17 (io), 42 I/O18 (io), 43 I/O19 (io), 44 I/O20 (io), 45 I/O21 (io), 46 I/O22 (io), 47 I/O23 (io), 48 I/O24 (io), 49 NC, 50 NC, 51 NC, 52 NC, 53 I/O25 (io), 54 I/O26 (io), 55 I/O27 (io), 56 I/O28 (io), 57 I/O29 (io), 58 I/O30 (io), 59 I/O31 (io), 60 SCLK/IN3 (in), 61 Y3 (in), 62 Y2 (in), 63 GND (power), 64 VCC (power), 65 Y1 (in), 66 GOE0/IN4 (in), 67 I/O32 (io), 68 I/O33 (io), 69 I/O34 (io), 70 I/O35 (io), 71 I/O36 (io), 72 I/O37 (io), 73 I/O38 (io), 74 NC, 75 NC, 76 NC, 77 NC, 78 I/O39 (io), 79 I/O40 (io), 80 I/O41 (io), 81 I/O42 (io), 82 I/O43 (io), 83 I/O44 (io), 84 I/O45 (io), 85 I/O46 (io), 86 I/O47 (io), 87 GOE1/IN5 (in), 88 GND (power), 89 IN6 (in), 90 I/O48 (io), 91 I/O49 (io), 92 I/O50 (io), 93 I/O51 (io), 94 I/O52 (io), 95 I/O53 (io), 96 I/O54 (io), 97 I/O55 (io), 98 I/O56 (io), 99 NC, 100 NC

## ispLSI1032EA-100LT100
designator U?
In-System Programmable High-Density PLD; Note: Pins 66 and 87 have dual function capability which is software selectable.; Published: 23-Sep-2002; LatestRevisionDate: 13-Apr-2006; LatestRevisionNote: IPC-7351 Footprint Added.; DatasheetVersion: Jun-2000; PackageVersion: pkg_32, Aug-2005; PackageReference: TQFP100; Publisher: Altium Limited; PackageDescription: 100-Pin Thin Quad Flat Pack (TQFP100); Code_JEDEC: MS-026-BED; ComponentLink1Description: Manufacturer Link; ComponentLink1URL: http://www.latticesemi.com/products/mature/index.cfm; ComponentLink2Description: Datasheet; ComponentLink2URL: http://www.latticesemi.com/lit/docs/datasheets/cpld/1032ea.pdf
footprint TQFP100_N (Thin QFP, 100-Leads, Body 14x14mm, Pitch 0.5mm, IPC Medium Density)
footprint TQFP100_L (Thin QFP, 100-Leads, Body 14x14mm, Pitch 0.5mm, IPC High Density)
footprint TQFP100_M (Thin QFP, 100-Leads, Body 14x14mm, Pitch 0.5mm, IPC Low Density)
3D model 1032EA-TQFP100 (100-Pin Thin Quad Flat Pack (TQFP100))
pins: 1 NC, 2 NC, 3 I/O57 (io), 4 I/O58 (io), 5 I/O59 (io), 6 I/O60 (io), 7 I/O61 (io), 8 I/O62 (io), 9 I/O63 (io), 10 IN7 (in), 11 Y0 (in), 12 VCC (power), 13 GND (power), 14 VCCIO (power), 15 ~{RESET} (in), 16 TDI (in), 17 I/O0 (io), 18 I/O1 (io), 19 I/O2 (io), 20 I/O3 (io), 21 I/O4 (io), 22 I/O5 (io), 23 I/O6 (io), 24 NC, 25 NC, 26 NC, 27 NC, 28 I/O7 (io), 29 I/O8 (io), 30 I/O9 (io), 31 I/O10 (io), 32 I/O11 (io), 33 I/O12 (io), 34 I/O13 (io), 35 I/O14 (io), 36 I/O15 (io), 37 TMS (in), 38 GND (power), 39 TDO (out), 40 I/O16 (io), 41 I/O17 (io), 42 I/O18 (io), 43 I/O19 (io), 44 I/O20 (io), 45 I/O21 (io), 46 I/O22 (io), 47 I/O23 (io), 48 I/O24 (io), 49 NC, 50 NC, 51 NC, 52 NC, 53 I/O25 (io), 54 I/O26 (io), 55 I/O27 (io), 56 I/O28 (io), 57 I/O29 (io), 58 I/O30 (io), 59 I/O31 (io), 60 TCK (in), 61 Y3 (in), 62 Y2 (in), 63 GND (power), 64 VCC (power), 65 Y1 (in), 66 GOEO/IN4 (in), 67 I/O32 (io), 68 I/O33 (io), 69 I/O34 (io), 70 I/O35 (io), 71 I/O36 (io), 72 I/O37 (io), 73 I/O38 (io), 74 NC, 75 NC, 76 NC, 77 NC, 78 I/O39 (io), 79 I/O40 (io), 80 I/O41 (io), 81 I/O42 (io), 82 I/O43 (io), 83 I/O44 (io), 84 I/O45 (io), 85 I/O46 (io), 86 I/O47 (io), 87 GOE1/IN5 (in), 88 GND (power), 89 IN6 (in), 90 I/O48 (io), 91 I/O49 (io), 92 I/O50 (io), 93 I/O51 (io), 94 I/O52 (io), 95 I/O53 (io), 96 I/O54 (io), 97 I/O55 (io), 98 I/O56 (io), 99 NC, 100 NC

## ispLSI1032EA-125LT100
designator U?
In-System Programmable High-Density PLD; Note: Pins 66 and 87 have dual function capability which is software selectable.; Published: 23-Sep-2002; LatestRevisionDate: 13-Apr-2006; LatestRevisionNote: IPC-7351 Footprint Added.; DatasheetVersion: Jun-2000; PackageVersion: pkg_32, Aug-2005; PackageReference: TQFP100; Publisher: Altium Limited; PackageDescription: 100-Pin Thin Quad Flat Pack (TQFP100); Code_JEDEC: MS-026-BED; ComponentLink1Description: Manufacturer Link; ComponentLink1URL: http://www.latticesemi.com/products/mature/index.cfm; ComponentLink2Description: Datasheet; ComponentLink2URL: http://www.latticesemi.com/lit/docs/datasheets/cpld/1032ea.pdf
footprint TQFP100_N (Thin QFP, 100-Leads, Body 14x14mm, Pitch 0.5mm, IPC Medium Density)
footprint TQFP100_L (Thin QFP, 100-Leads, Body 14x14mm, Pitch 0.5mm, IPC High Density)
footprint TQFP100_M (Thin QFP, 100-Leads, Body 14x14mm, Pitch 0.5mm, IPC Low Density)
3D model 1032EA-TQFP100 (100-Pin Thin Quad Flat Pack (TQFP100))
pins: 1 NC, 2 NC, 3 I/O57 (io), 4 I/O58 (io), 5 I/O59 (io), 6 I/O60 (io), 7 I/O61 (io), 8 I/O62 (io), 9 I/O63 (io), 10 IN7 (in), 11 Y0 (in), 12 VCC (power), 13 GND (power), 14 VCCIO (power), 15 ~{RESET} (in), 16 TDI (in), 17 I/O0 (io), 18 I/O1 (io), 19 I/O2 (io), 20 I/O3 (io), 21 I/O4 (io), 22 I/O5 (io), 23 I/O6 (io), 24 NC, 25 NC, 26 NC, 27 NC, 28 I/O7 (io), 29 I/O8 (io), 30 I/O9 (io), 31 I/O10 (io), 32 I/O11 (io), 33 I/O12 (io), 34 I/O13 (io), 35 I/O14 (io), 36 I/O15 (io), 37 TMS (in), 38 GND (power), 39 TDO (out), 40 I/O16 (io), 41 I/O17 (io), 42 I/O18 (io), 43 I/O19 (io), 44 I/O20 (io), 45 I/O21 (io), 46 I/O22 (io), 47 I/O23 (io), 48 I/O24 (io), 49 NC, 50 NC, 51 NC, 52 NC, 53 I/O25 (io), 54 I/O26 (io), 55 I/O27 (io), 56 I/O28 (io), 57 I/O29 (io), 58 I/O30 (io), 59 I/O31 (io), 60 TCK (in), 61 Y3 (in), 62 Y2 (in), 63 GND (power), 64 VCC (power), 65 Y1 (in), 66 GOEO/IN4 (in), 67 I/O32 (io), 68 I/O33 (io), 69 I/O34 (io), 70 I/O35 (io), 71 I/O36 (io), 72 I/O37 (io), 73 I/O38 (io), 74 NC, 75 NC, 76 NC, 77 NC, 78 I/O39 (io), 79 I/O40 (io), 80 I/O41 (io), 81 I/O42 (io), 82 I/O43 (io), 83 I/O44 (io), 84 I/O45 (io), 85 I/O46 (io), 86 I/O47 (io), 87 GOE1/IN5 (in), 88 GND (power), 89 IN6 (in), 90 I/O48 (io), 91 I/O49 (io), 92 I/O50 (io), 93 I/O51 (io), 94 I/O52 (io), 95 I/O53 (io), 96 I/O54 (io), 97 I/O55 (io), 98 I/O56 (io), 99 NC, 100 NC

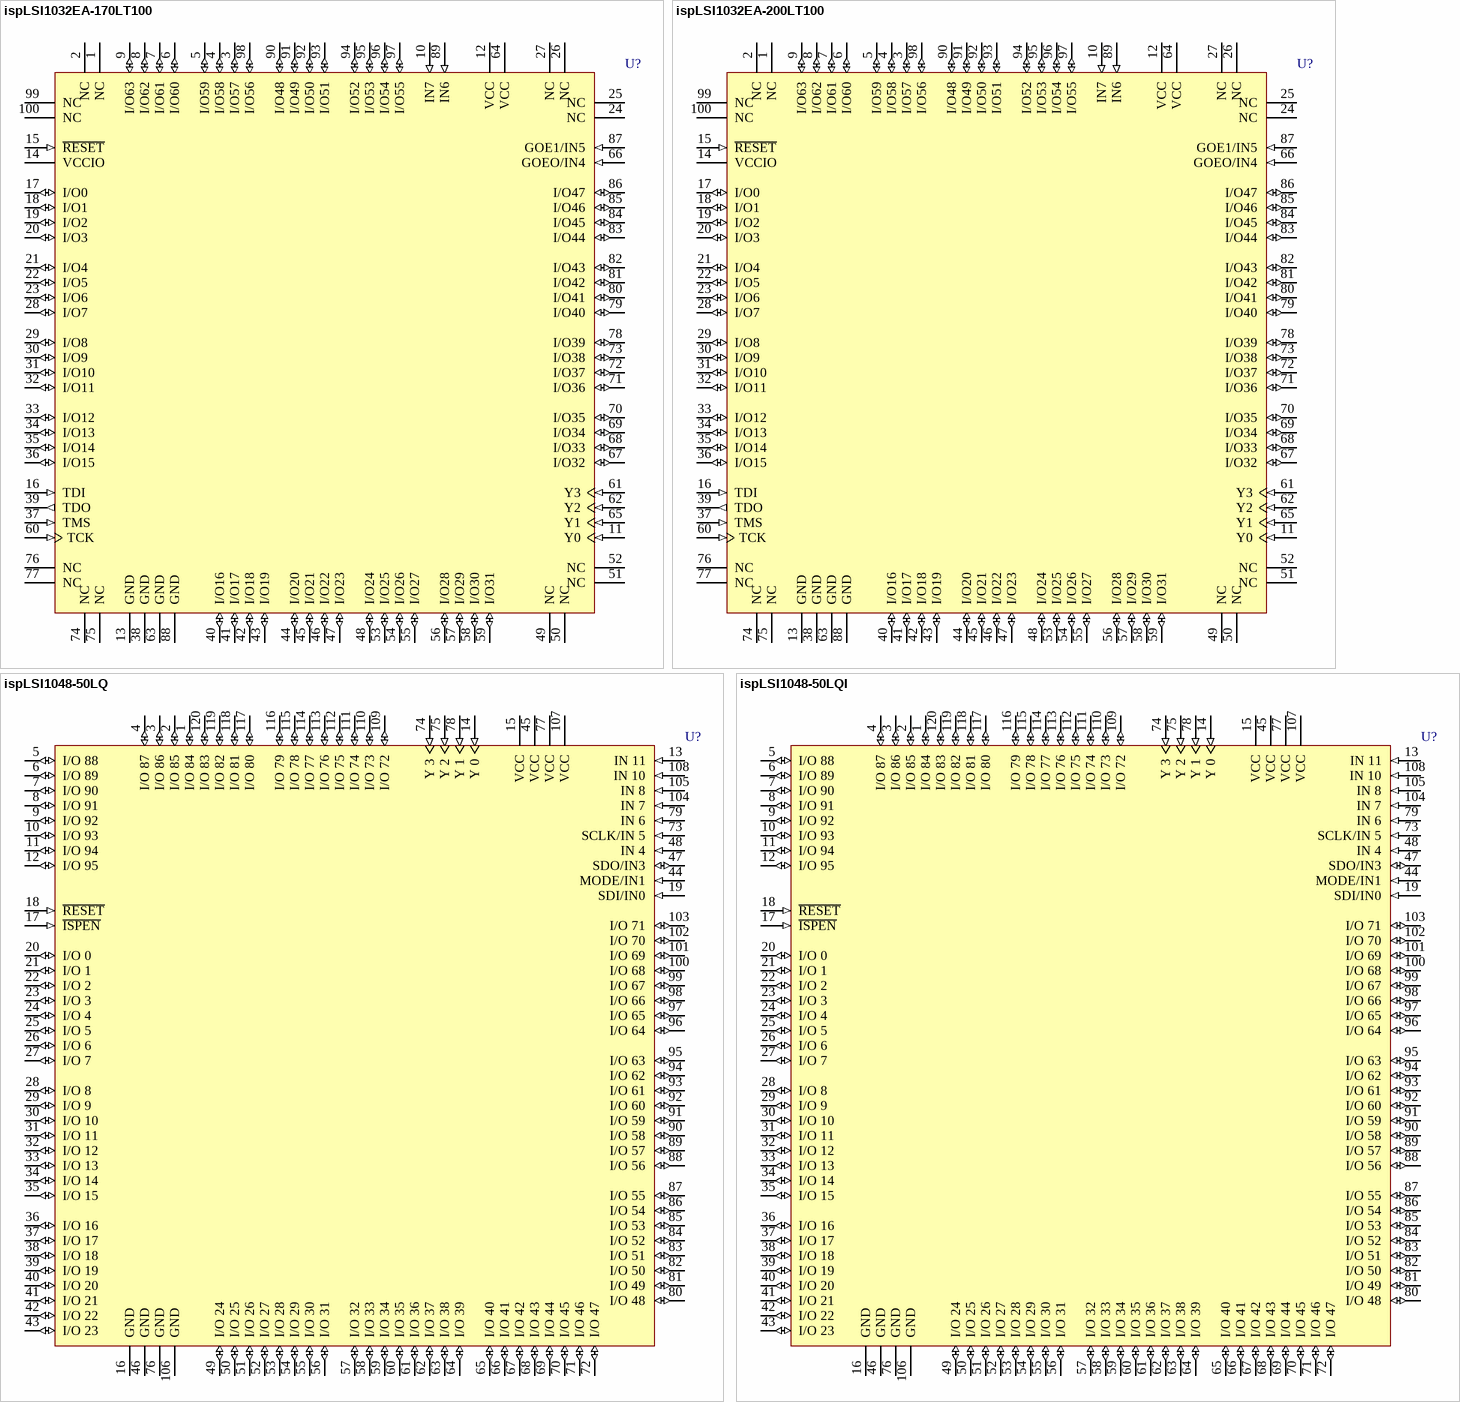
[diagram p12: symbols ispLSI1032EA-170LT100 to ispLSI1048-50LQI]

## ispLSI1032EA-170LT100
designator U?
In-System Programmable High-Density PLD; Note: Pins 66 and 87 have dual function capability which is software selectable.; Published: 23-Sep-2002; LatestRevisionDate: 13-Apr-2006; LatestRevisionNote: IPC-7351 Footprint Added.; DatasheetVersion: Jun-2000; PackageVersion: pkg_32, Aug-2005; PackageReference: TQFP100; Publisher: Altium Limited; PackageDescription: 100-Pin Thin Quad Flat Pack (TQFP100); Code_JEDEC: MS-026-BED; ComponentLink1Description: Manufacturer Link; ComponentLink1URL: http://www.latticesemi.com/products/mature/index.cfm; ComponentLink2Description: Datasheet; ComponentLink2URL: http://www.latticesemi.com/lit/docs/datasheets/cpld/1032ea.pdf
footprint TQFP100_N (Thin QFP, 100-Leads, Body 14x14mm, Pitch 0.5mm, IPC Medium Density)
footprint TQFP100_L (Thin QFP, 100-Leads, Body 14x14mm, Pitch 0.5mm, IPC High Density)
footprint TQFP100_M (Thin QFP, 100-Leads, Body 14x14mm, Pitch 0.5mm, IPC Low Density)
3D model 1032EA-TQFP100 (100-Pin Thin Quad Flat Pack (TQFP100))
pins: 1 NC, 2 NC, 3 I/O57 (io), 4 I/O58 (io), 5 I/O59 (io), 6 I/O60 (io), 7 I/O61 (io), 8 I/O62 (io), 9 I/O63 (io), 10 IN7 (in), 11 Y0 (in), 12 VCC (power), 13 GND (power), 14 VCCIO (power), 15 ~{RESET} (in), 16 TDI (in), 17 I/O0 (io), 18 I/O1 (io), 19 I/O2 (io), 20 I/O3 (io), 21 I/O4 (io), 22 I/O5 (io), 23 I/O6 (io), 24 NC, 25 NC, 26 NC, 27 NC, 28 I/O7 (io), 29 I/O8 (io), 30 I/O9 (io), 31 I/O10 (io), 32 I/O11 (io), 33 I/O12 (io), 34 I/O13 (io), 35 I/O14 (io), 36 I/O15 (io), 37 TMS (in), 38 GND (power), 39 TDO (out), 40 I/O16 (io), 41 I/O17 (io), 42 I/O18 (io), 43 I/O19 (io), 44 I/O20 (io), 45 I/O21 (io), 46 I/O22 (io), 47 I/O23 (io), 48 I/O24 (io), 49 NC, 50 NC, 51 NC, 52 NC, 53 I/O25 (io), 54 I/O26 (io), 55 I/O27 (io), 56 I/O28 (io), 57 I/O29 (io), 58 I/O30 (io), 59 I/O31 (io), 60 TCK (in), 61 Y3 (in), 62 Y2 (in), 63 GND (power), 64 VCC (power), 65 Y1 (in), 66 GOEO/IN4 (in), 67 I/O32 (io), 68 I/O33 (io), 69 I/O34 (io), 70 I/O35 (io), 71 I/O36 (io), 72 I/O37 (io), 73 I/O38 (io), 74 NC, 75 NC, 76 NC, 77 NC, 78 I/O39 (io), 79 I/O40 (io), 80 I/O41 (io), 81 I/O42 (io), 82 I/O43 (io), 83 I/O44 (io), 84 I/O45 (io), 85 I/O46 (io), 86 I/O47 (io), 87 GOE1/IN5 (in), 88 GND (power), 89 IN6 (in), 90 I/O48 (io), 91 I/O49 (io), 92 I/O50 (io), 93 I/O51 (io), 94 I/O52 (io), 95 I/O53 (io), 96 I/O54 (io), 97 I/O55 (io), 98 I/O56 (io), 99 NC, 100 NC